# Altium footprint library General.PcbLib: 446 footprints (part 2 of 28)
Each footprint in its own frame and in the unit in brackets; x right, y up, seen from the top. Pads: shape width x height; smd on the part's side, far side on the other; paste and mask are expansions set on the pad; w line width, h text height; cw(c..) or ccw(c..) is an arc to the next point about the centre after c.
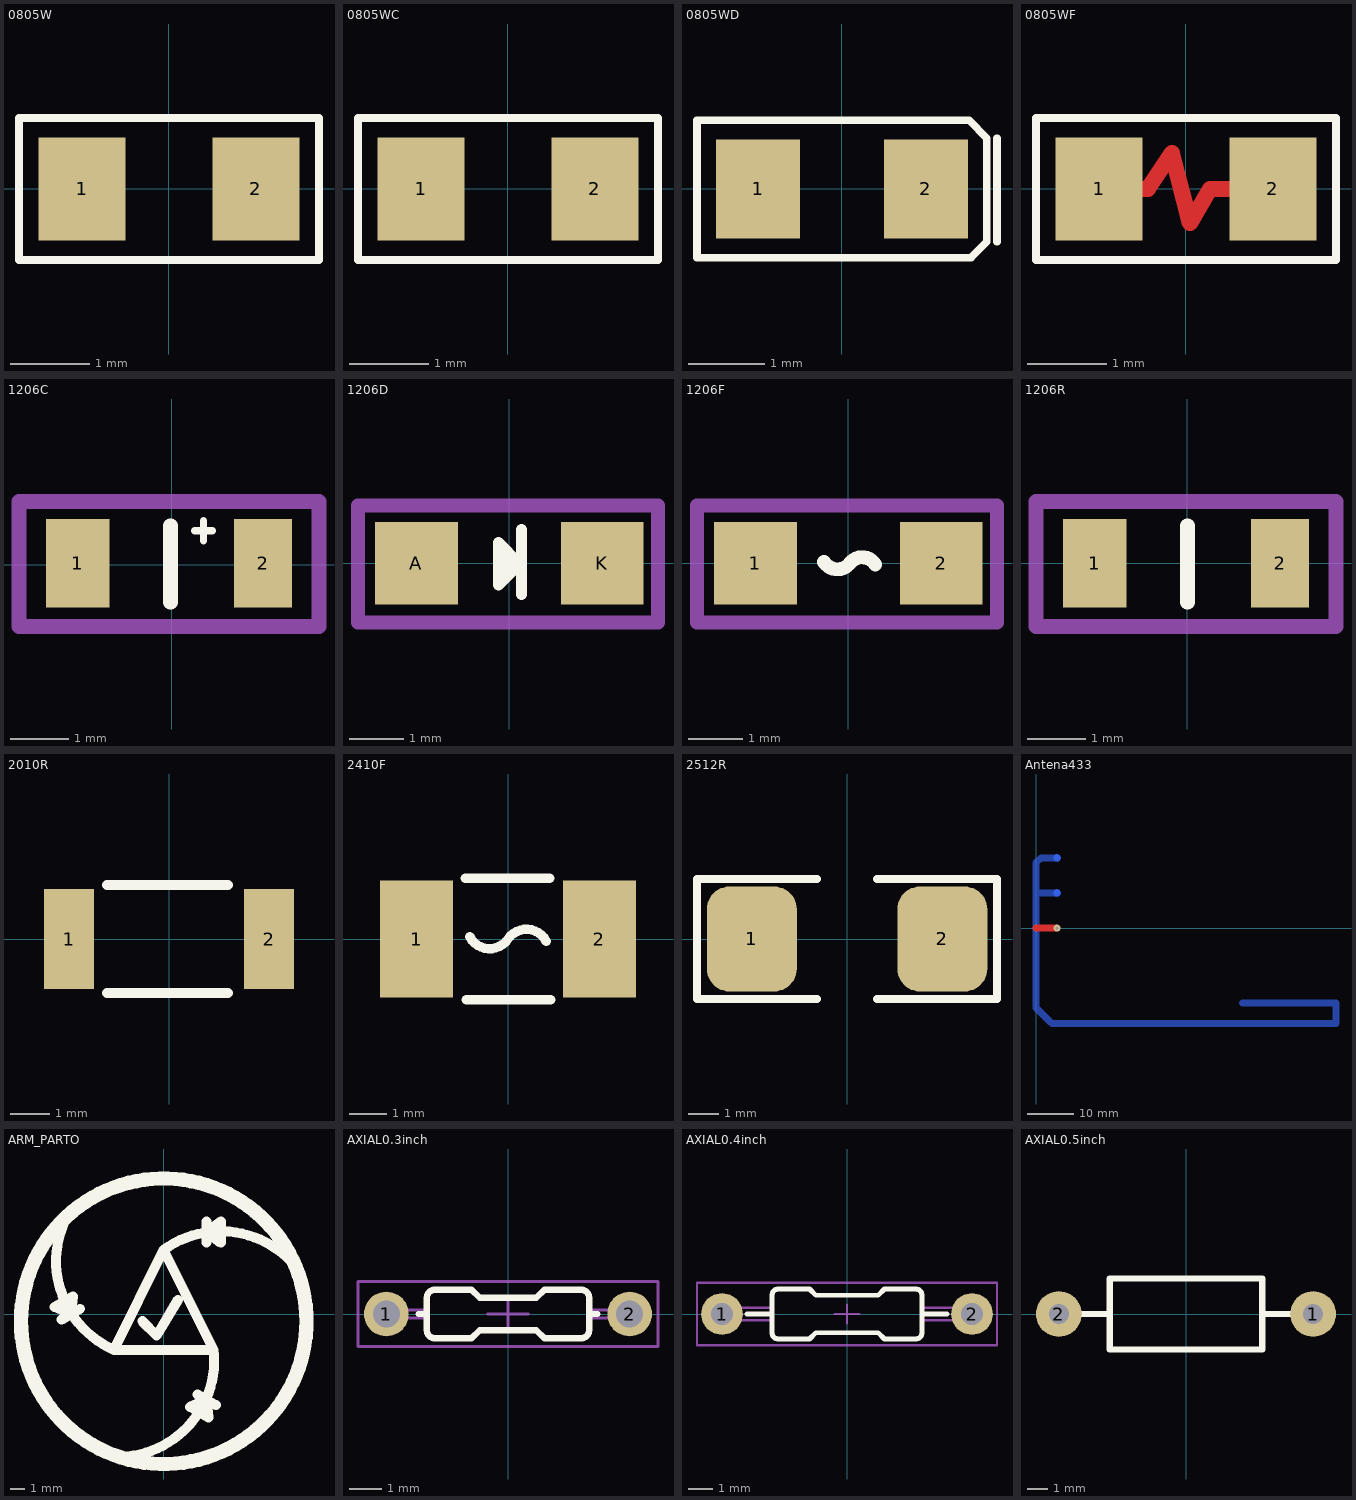
[diagram p1: the footprints below, top view; thin cyan lines are the x and y axes]

## 0805W [mm]
pads (2):
  rect 1.1x1.3 smd: 1(-1.1,0) 2(1.1,0)
Top Overlay:
  lines w0.1: -1.9,-0.9 -1.9,0 -1.9,0.9 1.9,0.9 1.9,-0.9 -1.9,-0.9
3D body "SW3dPS-0805 SMD Resistor.STEP": height 0.78, standoff 0, extent -1,-0.625 1,0.625

## 0805WC [mm]
pads (2):
  rect 1.1x1.3 smd: 1(-1.1,0) 2(1.1,0)
Top Overlay:
  lines w0.1: -1.9,-0.9 -1.9,0 -1.9,0.9 1.9,0.9 1.9,-0.9 -1.9,-0.9
3D body "0805 SMD Capacitor.STEP": height 0.78, standoff 0, extent -1.006,-0.625 0.994,0.625

## 0805WD [mm]
pads (2):
  rect 1.1x1.3 smd: 1(-1.1,0) 2(1.1,0)
Top Overlay:
  lines w0.1: 2.032,-0.691 2.032,0.665 ; -1.9,-0.9 -1.9,0 -1.9,0.9 1.665,0.9 1.9,0.665 1.9,-0.691 1.691,-0.9 -1.9,-0.9
3D body "User Library-LED0805.step": height 0.8, standoff 0, extent -1.084,-0.686 1.016,0.664

## 0805WF [mm]
pads (2):
  rect 1.1x1.3 smd: 1(-1.1,0) 2(1.1,0)
Top Layer:
  lines w0.203: -1.1,0 -0.483,0 -0.178,0.457 0.051,-0.432 0.305,0 1.1,0
Top Overlay:
  lines w0.1: -1.9,-0.9 1.9,-0.9 1.9,0.9 -1.9,0.9 -1.9,0 -1.9,-0.9

## 1206C [mil]
pads (2):
  rect 43.31x60 smd: 1(-64,1)
  rect 39.37x60 smd: 2(62,1)
Top Overlay:
  lines w5: 15.53,23.02 27.41,23.02 ; 21.43,16.13 21.43,29.91
  lines w10: -1,-25.58 -1,26.59
Mechanical 15:
  lines w10: -104,-42 -104,43 100,43 100,-42 -104,-42
3D body "1206C.step": height 67.32, standoff 0, extent -65.93,-32.07 67.93,34.08

## 1206D [mil]
pads (2):
  rect 60x60 smd: A(-67.5,0) K(67.5,0)
Top Overlay:
  lines w8: 7.07,-0.77 -7.93,-15.77 -7.93,15.02 7.07,0.02 ; 8.84,-22.62 8.84,24.62
  lines w12: -5.72,0.02 5.38,0.02
Mechanical 15:
  lines w10: -110,-43 -110,42 108,42 108,-43 -110,-43
3D body "1206D.step": height 56.54, standoff -0.54, extent -72.9,-28.47 64.9,28.47

## 1206F [mil]
pads (2):
  rect 60x60 smd: 1(-67.5,0) 2(67.5,0)
Top Overlay:
  lines w10: -17.63,0.95 ccw(c-8,7) 0.98,0.02 cw(c9.96,-6.97) 19.59,-0.92
Mechanical 15:
  lines w10: -110,-43 -110,42 108,42 108,-43 -110,-43
3D body "1206F.step": height 22.09, standoff -0.04, extent -64.03,-33 62.03,32.04

## 1206R [mil]
pads (2):
  rect 43.31x60 smd: 1(-63,0)
  rect 39.37x60 smd: 2(63,0)
Top Overlay:
  lines w10: 0,-26.57 0,25.59
Mechanical 15:
  lines w10: -103,-43 101,-43 101,42 -103,42 -103,-43
3D body "User Library-1206 SMD Resistor.step": height 39.45, standoff 0, extent -62.99,-31.49 63,31.51

## 2010R [mm]
pads (2):
  rect 1.27x2.54 smd: 1(-2.54,0) 2(2.54,0)
Top Overlay:
  lines w0.254: -1.575,-1.372 1.499,-1.372 ; -1.575,1.372 1.499,1.372
3D body "R2010-2.step": height 0.6, standoff 0, extent -2.551,-1.25 2.449,1.25

## 2410F [mm]
pads (2):
  rect 1.96x3.15 smd: 1(-2.45,0) 2(2.45,0)
Top Overlay:
  lines w0.254: -1.143,1.626 1.118,1.626 ; -1.118,-1.626 1.143,-1.626 ; -1.025,0.058 ccw(c-0.495,0.339) 0,0 cw(c0.495,-0.339) 1.025,-0.058

## 2512R [mm]
pads (2):
  rrect50% 3x3.5 smd: 1(-3.175,0) 2(3.175,0)
Top Overlay:
  lines w0.254: -1,-2 -5,-2 -5,2 -1,2 ; 1,-2 5,-2 5,2 1,2
3D body "User Library-2512 SMD Resistor.step": height 1.6, standoff 0, extent -3.175,-1.5 3.175,1.5

## Antena433 [mm]
pads (3):
  round 1.5 hole 0.7 unplated: 1(4.5,0)
  round 1.5 smd far side: 2(4.5,7.5) 2(4.5,15)
Top Layer:
  lines w1.5: 0,0 4.5,0
Bottom Layer:
  lines w1.5: 0.039,7.5 4.496,7.5 ; 4.496,15 1.039,15 0.039,14 0.039,-17 3.039,-20 3.435,-20.397 64.039,-20.397 64.039,-17 64.039,-16 44.039,-16

## ARM_PARTO [mm]
Top Overlay:
  circle w1: c0,-0.5 r10
  lines w0.7: -7.15,-0.375 -5.85,0.375 ; -6.951,6.477 ccw(c-0.737,3.714) -3.5,-2.5 ; -2.549,-9.977 ccw(c-3.263,-3.214) 3.5,-2.5 ; -1.5,-0.5 -0.5,-1.5 1,1 ; 2.35,-5.625 3.65,-6.375 ; 3,5 3,6.5 ; 9.5,3 ccw(c4,-1) 0,4.5 ; -3.5,-2.5 3.5,-2.5 ; -3.5,-2.5 0,4.5 ; 0,4.5 3.5,-2.5 ; -7.65,0.491 -6.35,1.241 -6.5,0 -7.65,0.491 ; 1.85,-6.491 3,-6 3.15,-7.241 1.85,-6.491 ; 3,5.75 4,6.5 4,5 3,5.75

## AXIAL0.3inch [mm] "Resistor, Axial; Body 5.08 x 1.6 mm ,Pitch 7.62mm"
height 1.524
pads (2):
  round 1.4 hole 0.85: 1(-3.81,0) 2(3.81,0)
Top Overlay:
  lines w0.2: -2.794,0 -2.54,0 ; 2.543,0 2.794,0 ; -2.54,-0.508 ccw(c-2.286,-0.508) -2.286,-0.762 -1.143,-0.762 -0.889,-0.508 0.889,-0.508 1.143,-0.762 2.286,-0.762 ccw(c2.286,-0.508) 2.54,-0.508 2.54,0.508 ccw(c2.286,0.508) 2.286,0.762 1.143,0.762 0.889,0.508 -0.889,0.508 -1.143,0.762 -2.286,0.762 ccw(c-2.286,0.508) -2.54,0.508 -2.54,-0.508
Mechanical 13:
  lines w0.1: -3.683,-0.127 -3.683,0.127 ; -2.54,-0.127 -3.937,-0.127 cw(c-3.937,0) -4.064,0 cw(c-3.937,0) -3.937,0.127 -2.54,0.127 ; 2.54,-0.127 3.937,-0.127 ccw(c3.937,0) 4.064,0 ccw(c3.937,0) 3.937,0.127 2.54,0.127 ; 3.683,-0.127 3.683,0.127 ; -2.54,-0.508 ccw(c-2.286,-0.508) -2.286,-0.762 -1.143,-0.762 -0.889,-0.508 0.889,-0.508 1.143,-0.762 2.286,-0.762 ccw(c2.286,-0.508) 2.54,-0.508 2.54,0.508 ccw(c2.286,0.508) 2.286,0.762 1.143,0.762 0.889,0.508 -0.889,0.508 -1.143,0.762 -2.286,0.762 ccw(c-2.286,0.508) -2.54,0.508 -2.54,-0.508
Mechanical 15:
  lines w0.1: -0.635,0 0,0 ; 0,-0.508 0,0 ; 0,0.508 0,0 ; 0.635,0 0,0 ; -4.699,-1.016 4.699,-1.016 4.699,1.016 -4.699,1.016 -4.699,-1.016
3D body: height 1.52, standoff 0, extent -2.541,-0.763 2.541,0.763
3D body: height 0.9, standoff 0.7, extent -3.683,-0.127 -2.54,0.127
3D body: height 0.9, standoff 0, extent -4.064,-0.127 -3.683,0.127
3D body: height 0.9, standoff 0, extent 3.683,-0.127 4.064,0.127
3D body: height 0.9, standoff 0.7, extent 2.54,-0.127 3.683,0.127

## AXIAL0.4inch [mm] "Resistor, Axial; Body 6.1 x 2mm ,Pitch 10.16mm"
height 2.032
pads (2):
  round 1.7 hole 0.9: 1(-5.08,0) 2(5.08,0)
Top Overlay:
  lines w0.2: -4.064,0 -3.048,0 ; 3.048,0 4.064,0 ; -3.048,-0.762 ccw(c-2.794,-0.762) -2.794,-1.016 -1.524,-1.016 -1.27,-0.762 1.27,-0.762 1.524,-1.016 2.794,-1.016 ccw(c2.794,-0.762) 3.048,-0.762 3.048,0.762 ccw(c2.794,0.762) 2.794,1.016 1.524,1.016 1.27,0.762 -1.27,0.762 -1.524,1.016 -2.794,1.016 ccw(c-2.794,0.762) -3.048,0.762 -3.048,-0.762
Mechanical 13:
  lines w0.1: -4.953,-0.254 -4.953,0.254 ; -3.048,-0.254 -5.207,-0.254 cw(c-5.207,-0.127) -5.334,-0.127 -5.334,0.127 cw(c-5.207,0.127) -5.207,0.254 -3.048,0.254 ; 3.048,-0.254 5.207,-0.254 ccw(c5.207,-0.127) 5.334,-0.127 5.334,0.127 ccw(c5.207,0.127) 5.207,0.254 3.048,0.254 ; 4.953,-0.254 4.953,0.254 ; -3.048,-0.762 ccw(c-2.794,-0.762) -2.794,-1.016 -1.524,-1.016 -1.27,-0.762 1.27,-0.762 1.524,-1.016 2.794,-1.016 ccw(c2.794,-0.762) 3.048,-0.762 3.048,0.762 ccw(c2.794,0.762) 2.794,1.016 1.524,1.016 1.27,0.762 -1.27,0.762 -1.524,1.016 -2.794,1.016 ccw(c-2.794,0.762) -3.048,0.762 -3.048,-0.762
Mechanical 15:
  lines w0.1: -0.508,0 0,0 ; 0,-0.381 0,0 ; 0,0.381 0,0 ; 0.508,0 0,0 ; -6.096,-1.27 6.096,-1.27 6.096,1.27 -6.096,1.27 -6.096,-1.27
3D body "SW3dPS-AXIAL_RESISTOR(0.25W).STEP": height 2.58, standoff -1.52, extent -5.425,-1.282 5.375,1.118

## AXIAL0.5inch [mil]
height 62.99
pads (2):
  round 90 hole 39.37: 1(250,0) 2(-250,0)
Top Overlay:
  lines w12: -210,0 -150,0 ; 150,0 210,0 ; -150,-70 -150,70 150,70 150,-70 -150,-70